# Altium footprint library CRD25DA12N-FMC.PcbLib: 152 footprints (part 2 of 10)
Each footprint in its own frame and in the unit in brackets; x right, y up, seen from the top. Pads: shape width x height; smd on the part's side, far side on the other; paste and mask are expansions set on the pad; w line width, h text height; cw(c..) or ccw(c..) is an arc to the next point about the centre after c.
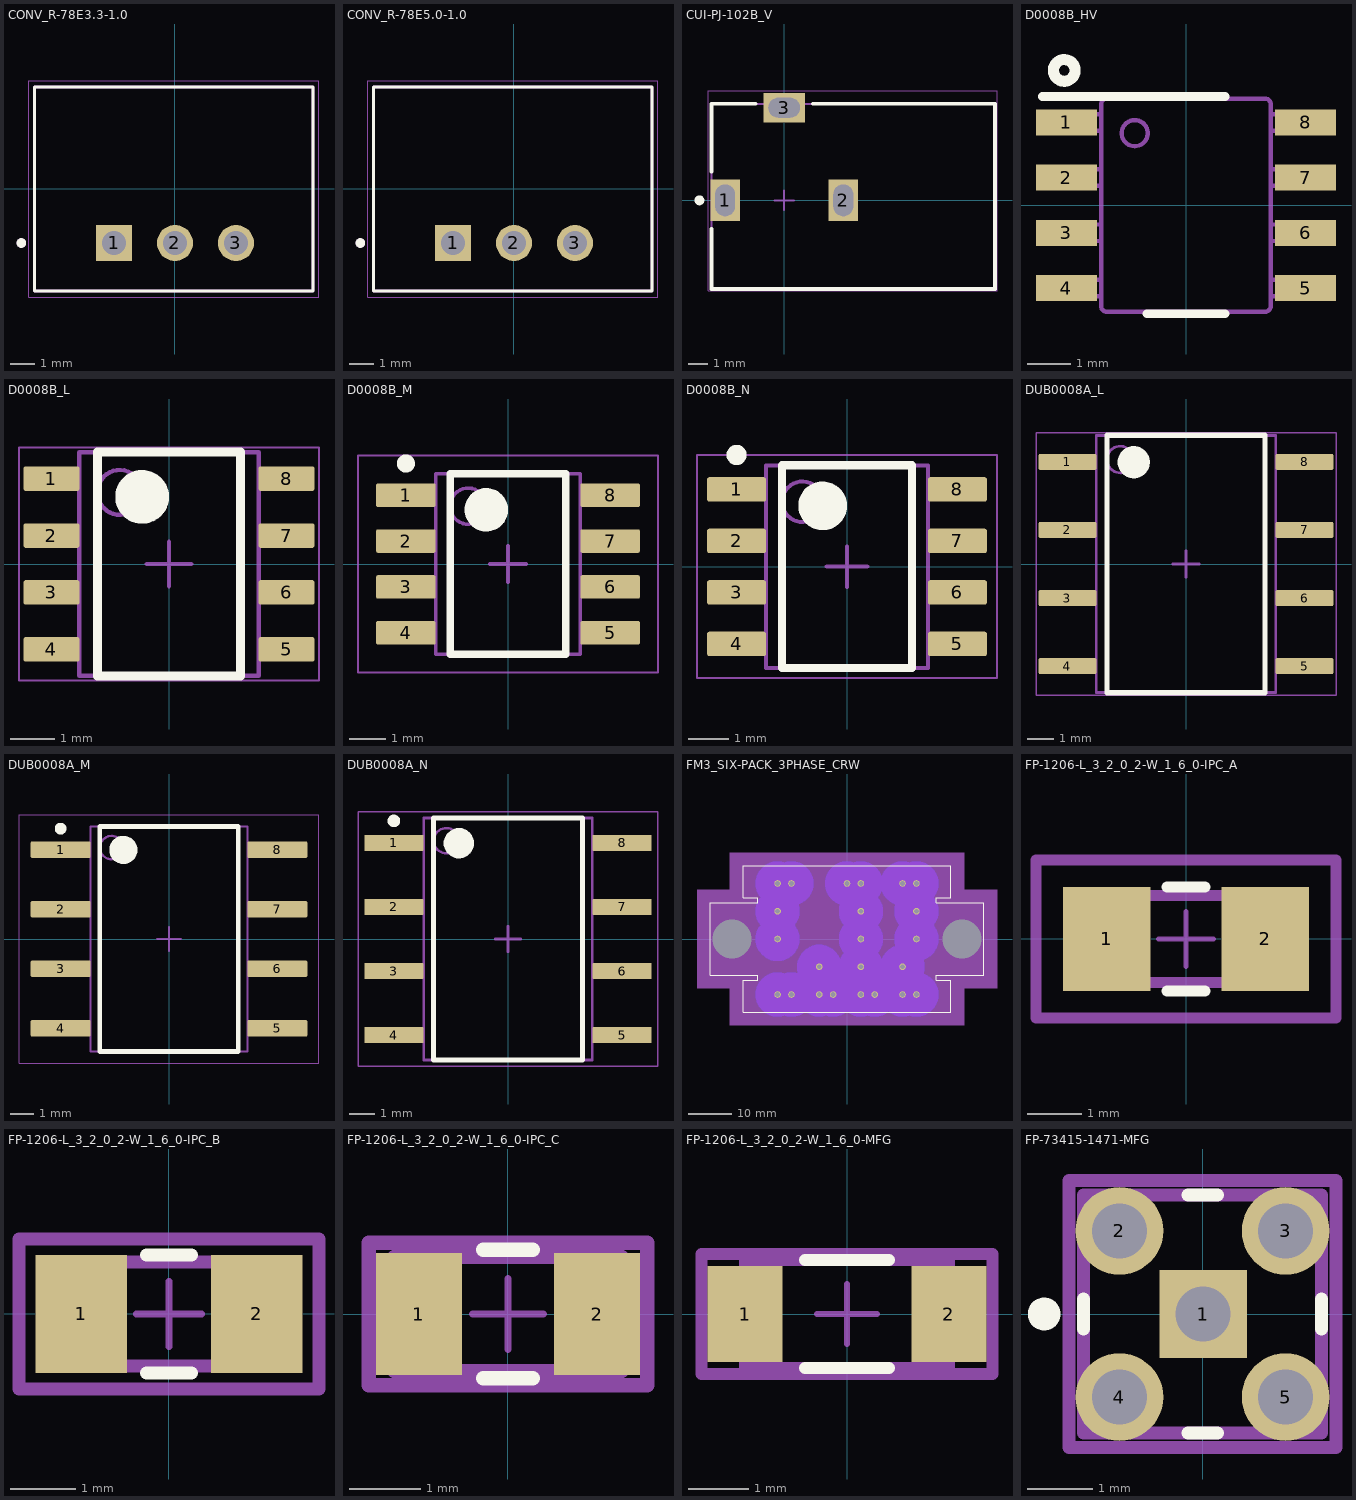
[diagram p1: the footprints below, top view; thin cyan lines are the x and y axes]

## CONV_R-78E3.3-1.0 [mm]
pads (3):
  rect 1.508x1.508 hole 1: 1(-2.54,-2.25)
  round 1.508 hole 1: 2(0,-2.25) 3(2.54,-2.25)
Top Overlay:
  circle w0.2: c-6.4,-2.25 r0.1
  lines w0.127: -5.85,-4.25 -5.85,4.25 5.75,4.25 5.75,-4.25 -5.85,-4.25
Top Designator:
  text ".Designator" at 7.33,0.508 h1.52
Mechanical 13:
  circle w0.2: c-6.4,-2.25 r0.1
  lines w0.127: -5.85,-4.25 -5.85,4.25 5.75,4.25 5.75,-4.25 -5.85,-4.25
Mechanical 15:
  lines w0.05: -6.1,-4.5 -6.1,4.5 6,4.5 6,-4.5 -6.1,-4.5
3D body "step_temp.STEP": height 9.9, standoff -4.6, extent -5.8,-4.25 5.8,4.25

## CONV_R-78E5.0-1.0 [mm]
pads (3):
  rect 1.508x1.508 hole 1: 1(-2.54,-2.25)
  round 1.508 hole 1: 2(0,-2.25) 3(2.54,-2.25)
Top Overlay:
  circle w0.2: c-6.4,-2.25 r0.1
  lines w0.127: -5.85,-4.25 -5.85,4.25 5.75,4.25 5.75,-4.25 -5.85,-4.25
Top Designator:
  text ".Designator" at 7.33,0.508 h1.52
Mechanical 13:
  circle w0.2: c-6.4,-2.25 r0.1
  lines w0.127: -5.85,-4.25 -5.85,4.25 5.75,4.25 5.75,-4.25 -5.85,-4.25
Mechanical 15:
  lines w0.05: -6.1,-4.5 -6.1,4.5 6,4.5 6,-4.5 -6.1,-4.5
3D body "step_temp.STEP": height 9.9, standoff -4.6, extent -5.8,-4.25 5.8,4.25

## CUI-PJ-102B_V [mm] "THD, 3-Leads, Body 14.4x9mm, Height 11mm"
height 11
pads (3):
  rect 1.5x2.1 hole 1 slot 1.6 at 90 deg: 1(-3,0) 2(3,0)
  rect 2.1x1.5 hole 1 slot 1.6 at 0 deg: 3(0,4.7)
Top Overlay:
  circle w0.25: c-4.3,0 r0.125
  lines w0.2: -3.7,-1.45 -3.7,-4.5 10.7,-4.5 10.7,4.9 1.45,4.9 ; -3.7,1.45 -3.7,4.9 -1.45,4.9
Mechanical 13:
  lines w0.1: -3.7,-4.5 10.7,-4.5 10.7,4.9 -3.7,4.9 -3.7,-4.5
Mechanical 15:
  lines w0.05: -3.85,-4.6 10.8,-4.6 10.8,5.55 -3.85,5.55 -3.85,-4.6
  lines w0.1: -0.5,0 0.5,0 ; 0,-0.5 0,0.5
3D body "pj-102b.stp": height 11, standoff -3.5, extent -3.7,-4.5 10.7,4.9

## D0008B_HV [mm]
pads (8):
  rect 1.4x0.6 smd paste+0 mask+0: 1(-2.75,1.905) 2(-2.75,0.635) 3(-2.75,-0.635) 4(-2.75,-1.905) 5(2.75,-1.905) 6(2.75,-0.635) 7(2.75,0.635) 8(2.75,1.905)
Top Overlay:
  circle w0.254: c-2.8,3.1 r0.25
  lines w0.2: -3.3,2.5 0.9,2.5 ; -0.9,-2.5 0.9,-2.5
Mechanical 13:
  lines w0.1: -2.375,-2.095 -1.995,-2.095 -1.952,-2.095 -1.952,-1.715 -1.995,-1.715 -2.375,-1.715 ; -2.375,-2.095 -2.589,-2.095 -3.002,-2.095 -3.002,-1.715 -2.589,-1.715 -2.375,-1.715 ; -2.375,-2.095 -2.375,-1.715 ; -2.375,-0.825 -1.995,-0.825 -1.952,-0.825 -1.952,-0.445 -1.995,-0.445 -2.375,-0.445 ; -2.375,-0.825 -2.589,-0.825 -3.002,-0.825 -3.002,-0.445 -2.589,-0.445 -2.375,-0.445 ; -2.375,-0.825 -2.375,-0.445 ; -2.375,0.445 -1.995,0.445 -1.952,0.445 -1.952,0.825 -1.995,0.825 -2.375,0.825 ; -2.375,0.445 -2.589,0.445 -3.002,0.445 -3.002,0.825 -2.589,0.825 -2.375,0.825 ; -2.375,0.445 -2.375,0.825 ; -2.375,1.715 -1.995,1.715 -1.952,1.715 -1.952,2.095 -1.995,2.095 -2.375,2.095 ; -2.375,1.715 -2.589,1.715 -3.002,1.715 -3.002,2.095 -2.589,2.095 -2.375,2.095 ; -2.375,1.715 -2.375,2.095 ; -0.332,-2.45 -1.825,-2.45 -1.826,-2.45 cw(c-1.825,-2.323) -1.952,-2.324 -1.952,-2.323 -1.952,2.323 -1.952,2.324 cw(c-1.825,2.323) -1.826,2.45 -1.825,2.45 -0.332,2.45 ; -0.332,-2.45 -0.182,-2.45 ; -0.332,-2.45 -0.182,-2.45 ; -0.332,2.45 -0.182,2.45 ; -0.332,2.45 -0.182,2.45 ; -0.182,-2.45 0.178,-2.45 ; -0.182,2.45 0.178,2.45 ; 0.178,-2.45 0.328,-2.45 ; 0.178,-2.45 0.328,-2.45 ; 0.178,2.45 0.328,2.45 ; 0.178,2.45 0.328,2.45 ; 0.328,-2.45 1.821,-2.45 1.822,-2.45 ccw(c1.821,-2.323) 1.948,-2.324 1.948,-2.323 1.948,2.323 1.948,2.324 ccw(c1.821,2.323) 1.822,2.45 1.821,2.45 0.328,2.45 ; 2.371,-2.095 2.585,-2.095 2.998,-2.095 2.998,-1.715 2.585,-1.715 2.371,-1.715 ; 2.371,-2.095 1.991,-2.095 1.948,-2.095 1.948,-1.715 1.991,-1.715 2.371,-1.715 ; 2.371,-2.095 2.371,-1.715 ; 2.371,-0.825 2.585,-0.825 2.998,-0.825 2.998,-0.445 2.585,-0.445 2.371,-0.445 ; 2.371,-0.825 1.991,-0.825 1.948,-0.825 1.948,-0.445 1.991,-0.445 2.371,-0.445 ; 2.371,-0.825 2.371,-0.445 ; 2.371,0.445 2.585,0.445 2.998,0.445 2.998,0.825 2.585,0.825 2.371,0.825 ; 2.371,0.445 1.991,0.445 1.948,0.445 1.948,0.825 1.991,0.825 2.371,0.825 ; 2.371,0.445 2.371,0.825 ; 2.371,1.715 2.585,1.715 2.998,1.715 2.998,2.095 2.585,2.095 2.371,2.095 ; 2.371,1.715 1.991,1.715 1.948,1.715 1.948,2.095 1.991,2.095 2.371,2.095 ; 2.371,1.715 2.371,2.095 ; -1.18,1.356 cw(c-1.18,1.656) -1.18,1.956 cw(c-1.18,1.656) -1.18,1.356
3D body: height 0.25, standoff 0, extent 0,0 0.254,0.254
3D body "D0008B.stp": height 1.63, standoff 0, extent -3.011,-2.451 3.011,2.451

## D0008B_L [mm] "SOIC, 8-Leads, Body 5x4mm, Pitch 1.27mm, IPC High Density"
height 1.75
pads (8):
  rrect18% 1.25x0.55 smd: 1(-2.625,1.905) 2(-2.625,0.635) 3(-2.625,-0.635) 4(-2.625,-1.905) 5(2.625,-1.905) 6(2.625,-0.635) 7(2.625,0.635) 8(2.625,1.905)
Top Overlay:
  circle w0.6: c-0.6,1.5 r0.3
  lines w0.2: -1.6,-2.5 -1.6,2.5 1.6,2.5 1.6,-2.5 -1.6,-2.5
Mechanical 1:
  text ".Designator" at -1.397,-0.254 h0.6
Mechanical 13:
  circle w0.1: c-1.1,1.6 r0.5
  lines w0.1: -2,-2.5 -2,2.5 2,2.5 2,-2.5 -2,-2.5
Mechanical 15:
  lines w0.05: -3.35,-2.6 -3.35,2.6 3.35,2.6 3.35,-2.6 -3.35,-2.6
  lines w0.1: -0.5,0 0.5,0 ; 0,-0.5 0,0.5
3D body "SOIC-8akaD0008AakaM08A.stp": height 1.63, standoff 0, extent -3,-2.45 3,2.45

## D0008B_M [mm] "SOIC, 8-Leads, Body 5x4mm, Pitch 1.27mm, IPC Low Density"
height 1.75
pads (8):
  rrect15% 1.65x0.65 smd: 1(-2.825,1.905) 2(-2.825,0.635) 3(-2.825,-0.635) 4(-2.825,-1.905) 5(2.825,-1.905) 6(2.825,-0.635) 7(2.825,0.635) 8(2.825,1.905)
Top Overlay:
  circle w0.6: c-0.6,1.5 r0.3
  circle w0.25: c-2.825,2.78 r0.125
  lines w0.2: -1.6,-2.5 1.6,-2.5 1.6,2.5 -1.6,2.5 -1.6,-2.5
Mechanical 1:
  text ".Designator" at -1.397,-0.254 h0.6
Mechanical 13:
  circle w0.1: c-1.1,1.6 r0.5
  lines w0.1: -2,-2.5 2,-2.5 2,2.5 -2,2.5 -2,-2.5
Mechanical 15:
  lines w0.05: -4.15,-3 4.15,-3 4.15,3 -4.15,3 -4.15,-3
  lines w0.1: -0.5,0 0.5,0 ; 0,-0.5 0,0.5
3D body "SOIC-8akaD0008AakaM08A.stp": height 1.63, standoff 0, extent -3,-2.45 3,2.45

## D0008B_N [mm] "SOIC, 8-Leads, Body 5x4mm, Pitch 1.27mm, IPC Medium Density"
height 1.75
pads (8):
  rrect17% 1.45x0.6 smd: 1(-2.725,1.905) 2(-2.725,0.635) 3(-2.725,-0.635) 4(-2.725,-1.905) 5(2.725,-1.905) 6(2.725,-0.635) 7(2.725,0.635) 8(2.725,1.905)
Top Overlay:
  circle w0.25: c-2.725,2.755 r0.125
  circle w0.6: c-0.6,1.5 r0.3
  lines w0.2: -1.6,-2.5 -1.6,2.5 1.6,2.5 1.6,-2.5 -1.6,-2.5
Mechanical 1:
  text ".Designator" at -1.397,-0.254 h0.6
Mechanical 13:
  circle w0.1: c-1.1,1.6 r0.5
  lines w0.1: -2,-2.5 -2,2.5 2,2.5 2,-2.5 -2,-2.5
Mechanical 15:
  lines w0.05: -3.7,-2.75 -3.7,2.75 3.7,2.75 3.7,-2.75 -3.7,-2.75
  lines w0.1: -0.5,0 0.5,0 ; 0,-0.5 0,0.5
3D body "SOIC-8akaD0008AakaM08A.stp": height 1.63, standoff 0, extent -3,-2.45 3,2.45

## DUB0008A_L [mm] "SOP, 8-Leads, Body 6.7x9.6mm, Pitch 2.54mm, IPC High Density"
height 4.85
pads (8):
  rrect17% 2.15x0.6 smd: 1(-4.425,3.81) 2(-4.425,1.27) 3(-4.425,-1.27) 4(-4.425,-3.81) 5(4.425,-3.81) 6(4.425,-1.27) 7(4.425,1.27) 8(4.425,3.81)
Top Overlay:
  circle w0.6: c-1.95,3.8 r0.3
  lines w0.2: -2.95,-4.8 -2.95,4.8 2.95,4.8 2.95,-4.8 -2.95,-4.8
Mechanical 1:
  text ".Designator" at -2.286,-0.381 h1
Mechanical 13:
  circle w0.1: c-2.45,3.9 r0.5
  lines w0.1: -3.35,-4.8 -3.35,4.8 3.35,4.8 3.35,-4.8 -3.35,-4.8
Mechanical 15:
  lines w0.05: -5.6,-4.9 -5.6,4.9 5.6,4.9 5.6,-4.9 -5.6,-4.9
  lines w0.1: -0.5,0 0.5,0 ; 0,-0.5 0,0.5
3D body "DUB0008A.stp": height 4.85, standoff 0, extent -5.242,-4.75 5.242,4.75

## DUB0008A_M [mm] "SOP, 8-Leads, Body 6.7x9.6mm, Pitch 2.54mm, IPC Low Density"
height 4.85
pads (8):
  rrect14% 2.55x0.7 smd: 1(-4.625,3.81) 2(-4.625,1.27) 3(-4.625,-1.27) 4(-4.625,-3.81) 5(4.625,-3.81) 6(4.625,-1.27) 7(4.625,1.27) 8(4.625,3.81)
Top Overlay:
  circle w0.6: c-1.95,3.8 r0.3
  circle w0.25: c-4.625,4.71 r0.125
  lines w0.2: -2.95,-4.8 2.95,-4.8 2.95,4.8 -2.95,4.8 -2.95,-4.8
Mechanical 1:
  text ".Designator" at -2.286,-0.254 h1
Mechanical 13:
  circle w0.1: c-2.45,3.9 r0.5
  lines w0.1: -3.35,-4.8 3.35,-4.8 3.35,4.8 -3.35,4.8 -3.35,-4.8
Mechanical 15:
  lines w0.05: -6.4,-5.3 6.4,-5.3 6.4,5.3 -6.4,5.3 -6.4,-5.3
  lines w0.1: -0.5,0 0.5,0 ; 0,-0.5 0,0.5
3D body "DUB0008A.stp": height 4.85, standoff 0, extent -5.242,-4.75 5.242,4.75

## DUB0008A_N [mm] "SOP, 8-Leads, Body 6.7x9.6mm, Pitch 2.54mm, IPC Medium Density"
height 4.85
pads (8):
  rrect15% 2.35x0.65 smd: 1(-4.525,3.81) 2(-4.525,1.27) 3(-4.525,-1.27) 4(-4.525,-3.81) 5(4.525,-3.81) 6(4.525,-1.27) 7(4.525,1.27) 8(4.525,3.81)
Top Overlay:
  circle w0.25: c-4.525,4.685 r0.125
  circle w0.6: c-1.95,3.8 r0.3
  lines w0.2: -2.95,-4.8 -2.95,4.8 2.95,4.8 2.95,-4.8 -2.95,-4.8
Mechanical 1:
  text ".Designator" at -2.54,-0.254 h1
Mechanical 13:
  circle w0.1: c-2.45,3.9 r0.5
  lines w0.1: -3.35,-4.8 -3.35,4.8 3.35,4.8 3.35,-4.8 -3.35,-4.8
Mechanical 15:
  lines w0.05: -5.95,-5.05 -5.95,5.05 5.95,5.05 5.95,-5.05 -5.95,-5.05
  lines w0.1: -0.5,0 0.5,0 ; 0,-0.5 0,0.5
3D body "DUB0008A.stp": height 4.85, standoff 0, extent -5.242,-4.75 5.242,4.75

## FM3_SIX-PACK_3PHASE_CRW [mm]
pads (25):
  round 1.524 hole 1.1: DC+_1(-6.4,-6.4) DC+_2(3.2,-6.4) DC+_3(12.8,-6.4) DC-1(-16,0) DC-2(3.2,0) DC-3(16,0) G1(-12.8,-12.8) G2(-16,12.8) G3(-3.2,-12.8) G4(3.2,12.8) G5(6.4,-12.8) G6(16,12.8) NTC1(12.8,-12.8) NTC2(16,-12.8) S1(-16,-12.8) S2(-12.8,12.8) S3(-6.4,-12.8) S4(0,12.8) S5(3.2,-12.8) S6(12.8,12.8) U(-16,6.4) V(3.2,6.4) W(16,6.4)
  round 0 hole 9 unplated: MH1(-26.5,0) MH2(26.5,0)
Bottom Layer keep-out:
  circle w6.2: c3.2,0 r2
  circle w6.2: c3.2,6.4 r2
  circle w6.2: c16,6.4 r2
  circle w6.2: c16,0 r2
  circle w6.2: c12.8,-6.4 r2
  circle w6.2: c3.2,-6.4 r2
  circle w6.2: c-6.4,-6.4 r2
  circle w6.2: c-16,0 r2
  circle w6.2: c-16,6.4 r2
  circle w6.2: c-16,-12.8 r2
  circle w6.2: c-12.8,-12.8 r2
  circle w6.2: c-6.4,-12.8 r2
  circle w6.2: c-3.2,-12.8 r2
  circle w6.2: c3.2,-12.8 r2
  circle w6.2: c6.4,-12.8 r2
  circle w6.2: c12.8,-12.8 r2
  circle w6.2: c16,-12.8 r2
  circle w6.2: c3.2,12.8 r2
  circle w6.2: c12.8,12.8 r2
  circle w6.2: c0,12.8 r2
  circle w6.2: c-12.8,12.8 r2
  circle w6.2: c-16,12.8 r2
  circle w6.2: c16,12.8 r2
Top Overlay:
  lines w0.152: -31.521,-8.331 -31.521,8.331 -20.625,8.331 -20.625,9.563 -23.927,9.563 -23.927,16.878 23.927,16.878 23.927,9.563 20.625,9.563 20.625,8.331 31.521,8.331 31.521,-8.331 20.625,-8.331 20.625,-9.563 23.927,-9.563 23.927,-16.878 -23.927,-16.878 -23.927,-9.563 -20.625,-9.563 -20.625,-8.331 -31.521,-8.331
Bottom Courtyard:
  text "Default Padstyle: EX60Y60D43P0" at -9.525,-21.831 h1.27
Bottom 3D Body:
  region: 26.975,19.926 -26.975,19.926 -26.975,11.379 -34.569,11.379 -34.569,-11.379 -26.975,-11.379 -26.975,-19.926 26.975,-19.926 26.975,-11.379 34.569,-11.379 34.569,11.379 26.975,11.379
Top Designator:
  text ".Designator" at 7.618,-0.694 h1.52
Mechanical 13:
  drawing of 27 lines, arcs and shapes, not listed
Mechanical 15:
  region: 20.752,-9.436 20.752,-8.458 31.648,-8.458 31.648,8.458 20.752,8.458 20.752,9.436 24.054,9.436 24.054,17.005 -24.054,17.005 -24.054,9.436 -20.752,9.436 -20.752,8.458 -31.648,8.458 -31.648,-8.458 -20.752,-8.458 -20.752,-9.436 -24.054,-9.436 -24.054,-17.005 24.054,-17.005 24.054,-9.436
  lines w0.152: -31.648,-8.458 -31.648,8.458 -20.752,8.458 -20.752,9.436 -24.054,9.436 -24.054,17.005 24.054,17.005 24.054,9.436 20.752,9.436 20.752,8.458 31.648,8.458 31.648,-8.458 20.752,-8.458 20.752,-9.436 24.054,-9.436 24.054,-17.005 -24.054,-17.005 -24.054,-9.436 -20.752,-9.436 -20.752,-8.458 -31.648,-8.458
3D body "McMaster-Carr 93070A095 - Alternative.STEP": height -7.7, standoff -16.5, extent -30,-3.5 -23,3.5
3D body "McMaster-Carr 93070A095 - Alternative.STEP": height -7.7, standoff -16.5, extent 23,-3.5 30,3.5
3D body: height 0.25, standoff 0, extent 0,0 0.254,0.254
3D body "CCB0xxM12FM3(Six_Pack)_External_POD_20200723_Branded_Origin.STEP": height 11.98, standoff -4.42, extent -31.4,-16.9 31.4,16.9

## FP-1206-L_3_2_0_2-W_1_6_0-IPC_A [mm]
pads (2):
  rect 1.604x1.906 smd paste+0 mask+0: 1(-1.451,0) 2(1.451,0)
Top Overlay:
  lines w0.2: -0.349,-0.953 0.349,-0.953 ; -0.349,0.953 0.349,0.953
Mechanical 5:
  lines w0.2: -2.753,-1.453 2.753,-1.453 2.753,1.453 -2.753,1.453 -2.753,-1.453
  text ".Designator" at 0,0.188 h1
Mechanical 13:
  lines w0.2: -1.6,-0.8 1.6,-0.8 1.6,0.8 -1.6,0.8 -1.6,-0.8
Mechanical 15:
  lines w0.2: -2.753,-1.453 2.753,-1.453 2.753,1.453 -2.753,1.453 -2.753,-1.453
Mechanical 16:
  lines w0.1: -0.5,0 0.5,0 ; 0,-0.5 0,0.5
3D body "Cap_Taiyo_Yuden_JMK316ABJ226KLHT_eec.STEP": height 0.25, standoff 0, extent -2.753,-1.453 2.753,1.453

## FP-1206-L_3_2_0_2-W_1_6_0-IPC_B [mm]
pads (2):
  rect 1.404x1.806 smd paste+0 mask+0: 1(-1.351,0) 2(1.351,0)
Top Overlay:
  lines w0.2: -0.349,-0.903 0.349,-0.903 ; -0.349,0.903 0.349,0.903
Mechanical 5:
  lines w0.2: -2.303,-1.153 2.303,-1.153 2.303,1.153 -2.303,1.153 -2.303,-1.153
  text ".Designator" at 0,0.188 h1
Mechanical 13:
  lines w0.2: -1.6,-0.8 1.6,-0.8 1.6,0.8 -1.6,0.8 -1.6,-0.8
Mechanical 15:
  lines w0.2: -2.303,-1.153 2.303,-1.153 2.303,1.153 -2.303,1.153 -2.303,-1.153
Mechanical 16:
  lines w0.1: -0.5,0 0.5,0 ; 0,-0.5 0,0.5
3D body "Cap_Taiyo_Yuden_JMK316ABJ226KLHT_eec.STEP": height 0.25, standoff 0, extent -2.303,-1.153 2.303,1.153

## FP-1206-L_3_2_0_2-W_1_6_0-IPC_C [mm]
pads (2):
  rect 1.204x1.706 smd paste+0 mask+0: 1(-1.251,0) 2(1.251,0)
Top Overlay:
  lines w0.2: -0.349,-0.9 0.349,-0.9 ; -0.349,0.9 0.349,0.9
Mechanical 5:
  lines w0.2: -1.953,-1 1.953,-1 1.953,1 -1.953,1 -1.953,-1
  text ".Designator" at 0,0.188 h1
Mechanical 13:
  lines w0.2: -1.6,-0.8 1.6,-0.8 1.6,0.8 -1.6,0.8 -1.6,-0.8
Mechanical 15:
  lines w0.2: -1.953,-1 1.953,-1 1.953,1 -1.953,1 -1.953,-1
Mechanical 16:
  lines w0.1: -0.5,0 0.5,0 ; 0,-0.5 0,0.5
3D body "Cap_Taiyo_Yuden_JMK316ABJ226KLHT_eec.STEP": height 0.25, standoff 0, extent -1.953,-1 1.953,1

## FP-1206-L_3_2_0_2-W_1_6_0-MFG [mm]
pads (2):
  rect 1.25x1.6 smd paste+0 mask+0: 1(-1.7,0) 2(1.7,0)
Top Overlay:
  lines w0.2: -0.7,-0.9 0.7,-0.9 ; -0.7,0.9 0.7,0.9
Mechanical 5:
  lines w0.2: -2.425,-1 -2.425,1 2.425,1 2.425,-1 -2.425,-1
  text ".Designator" at 0,0.188 h1
Mechanical 13:
  lines w0.2: -1.7,-0.9 -1.7,0.9 1.7,0.9 1.7,-0.9 -1.7,-0.9
Mechanical 15:
  lines w0.2: -2.425,-1 -2.425,1 2.425,1 2.425,-1 -2.425,-1
Mechanical 16:
  lines w0.1: -0.5,0 0.5,0 ; 0,-0.5 0,0.5
3D body "Cap_Taiyo_Yuden_JMK316ABJ226KLHT_eec.STEP": height 0.25, standoff 0, extent -2.425,-1 2.425,1

## FP-73415-1471-MFG [mm]
pads (5):
  rect 1.34x1.34 hole 0.84 paste-2539.97 mask+0: 1(0.01,0)
  round 1.34 hole 0.84 paste-2539.97 mask+0: 2(-1.27,1.27) 3(1.27,1.27) 4(-1.27,-1.27) 5(1.27,-1.27)
Top Overlay:
  circle w0.25: c-2.42,0 r0.125
  lines w0.2: -1.82,-0.225 -1.82,0.225 ; -0.225,-1.82 0.225,-1.82 ; -0.225,1.82 0.225,1.82 ; 1.82,-0.225 1.82,0.225
Mechanical 5:
  lines w0.2: -2.04,-2.04 -2.04,2.04 2.04,2.04 2.04,-2.04 -2.04,-2.04
  text ".Designator" at 0,0.188 h1
Mechanical 13:
  lines w0.2: -1.82,-1.82 -1.82,1.82 1.82,1.82 1.82,-1.82 -1.82,-1.82
Mechanical 15:
  lines w0.2: -2.04,-2.04 -2.04,2.04 2.04,2.04 2.04,-2.04 -2.04,-2.04
Mechanical 16:
  lines w0.1: -0.5,0 0.5,0 ; 0,-0.5 0,0.5
3D body "Conn_Molex_73415-1471_eec.STEP": height 0.25, standoff 0, extent -2.04,-2.04 2.04,2.04